# Altium footprint library SOP.PcbLib: 19 footprints (part 2 of 2)
Each footprint in its own frame and in the unit in brackets; x right, y up, seen from the top. Pads: shape width x height; smd on the part's side, far side on the other; paste and mask are expansions set on the pad; w line width, h text height; cw(c..) or ccw(c..) is an arc to the next point about the centre after c.
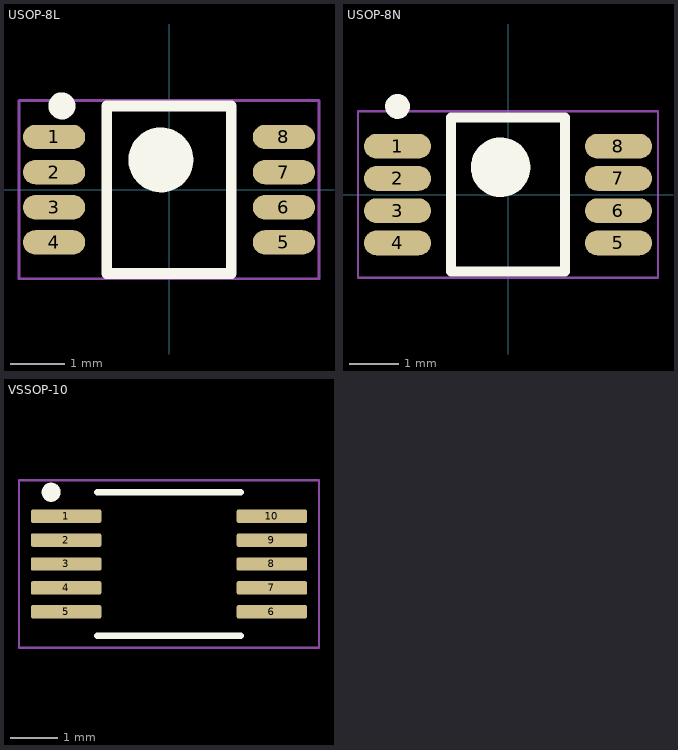
[diagram p1: the footprints below, top view; thin cyan lines are the x and y axes]

## USOP-8L [mm] "TSOP, 8-Leads, Body 3,00x3,00mm, Pitch 0,65mm, IPC High Density"
height 1.1
pads (8):
  oval 1.15x0.45 smd: 1(-2.125,0.975) 2(-2.125,0.325) 3(-2.125,-0.325) 4(-2.125,-0.975) 5(2.125,-0.975) 6(2.125,-0.325) 7(2.125,0.325) 8(2.125,0.975)
Top Overlay:
  circle w0.25: c-1.981,1.549 r0.125
  circle w0.6: c-0.15,0.55 r0.3
  lines w0.2: -1.15,-1.55 -1.15,1.55 1.15,1.55 1.15,-1.55 -1.15,-1.55
Top Assembly (Mech8):
  lines w0.05: -2.775,-1.65 2.775,-1.65 2.775,1.65 -2.775,1.65 -2.775,-1.65
3D body "TSOP65P490X110-8L.step": height 1.1, standoff 0, extent -2.452,-1.55 2.452,1.55

## USOP-8N [mm] "TSOP, 8-Leads, Body 3,00x3,00mm, Pitch 0,65mm, IPC Medium Density"
height 1.1
pads (8):
  oval 1.35x0.5 smd: 1(-2.225,0.975) 2(-2.225,0.325) 3(-2.225,-0.325) 4(-2.225,-0.975) 5(2.225,-0.975) 6(2.225,-0.325) 7(2.225,0.325) 8(2.225,0.975)
Top Overlay:
  circle w0.25: c-2.225,1.775 r0.125
  circle w0.6: c-0.15,0.55 r0.3
  lines w0.2: -1.15,-1.55 -1.15,1.55 1.15,1.55 1.15,-1.55 -1.15,-1.55
Top Assembly (Mech8):
  lines w0.05: -3.023,-1.676 3.023,-1.676 3.023,1.676 -3.023,1.676 -3.023,-1.676
3D body "TSOP65P490X110-8N.step": height 1.1, standoff 0, extent -2.452,-1.55 2.452,1.55

## VSSOP-10 [mm]
pads (10):
  rrect25% 1.47x0.28 smd: 1(-39.742,45.45) 2(-39.742,44.95) 3(-39.742,44.45) 4(-39.742,43.95) 5(-39.742,43.45) 6(-35.442,43.45) 7(-35.442,43.95) 8(-35.442,44.45) 9(-35.442,44.95) 10(-35.442,45.45)
Top Overlay:
  circle w0.2: c-40.055,45.95 r0.1
  lines w0.127: -39.092,42.95 -36.092,42.95 ; -39.092,45.95 -36.092,45.95
Top Assembly (Mech8):
  lines w0.05: -40.727,42.7 -40.727,46.2 -34.457,46.2 -34.457,42.7 -40.727,42.7
3D body "User Library-DGS0010A.STEP": height 1.1, standoff 0, extent -40.055,42.95 -35.129,45.95